# Altium footprint library myLibs.PcbLib: 48 footprints (part 2 of 3)
Each footprint in its own frame and in the unit in brackets; x right, y up, seen from the top. Pads: shape width x height; smd on the part's side, far side on the other; paste and mask are expansions set on the pad; w line width, h text height; cw(c..) or ccw(c..) is an arc to the next point about the centre after c.
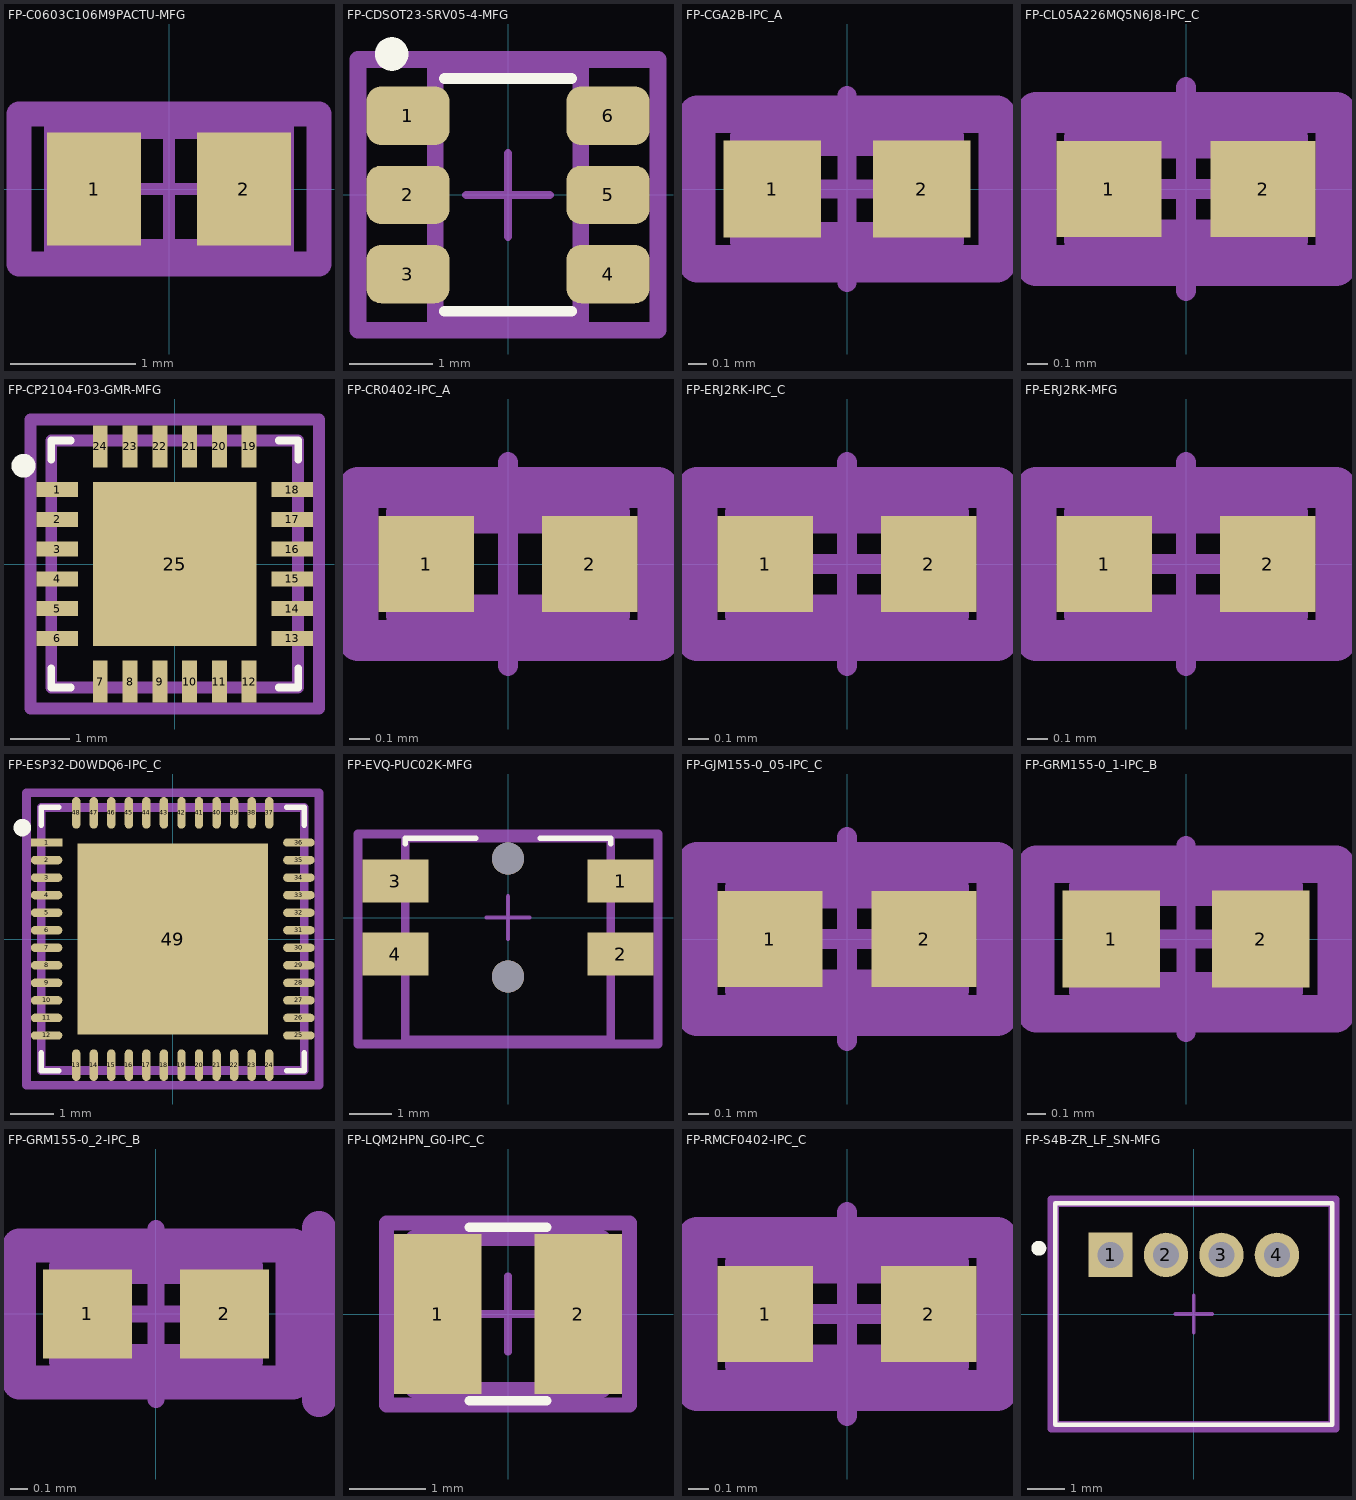
[diagram p1: the footprints below, top view; thin cyan lines are the x and y axes]

## FP-C0603C106M9PACTU-MFG [mm]
pads (2):
  rect 0.75x0.9 smd paste+0 mask+0: 1(-0.6,0) 2(0.6,0)
Top Assembly:
  lines w0.2: -1.2,-0.6 1.2,-0.6 1.2,0.6 -1.2,0.6 -1.2,-0.6
  text ".Designator" at 0.025,0.255 h1
Top 3D Body:
  lines w0.2: -0.9,-0.5 0.9,-0.5 0.9,0.5 -0.9,0.5 -0.9,-0.5
Top Courtyard:
  lines w0.2: -1.2,-0.6 1.2,-0.6 1.2,0.6 -1.2,0.6 -1.2,-0.6
Top Component Center:
  lines w0.1: -0.5,0 0.5,0 ; 0,-0.5 0,0.5
3D body "Cap_Kemet_C0603C106M9PACTU_eec.STEP": height 0.25, standoff 0, extent -1.2,-0.6 1.2,0.6

## FP-CDSOT23-SRV05-4-MFG [mm]
pads (6):
  rrect50% 1x0.7 smd paste+0 mask+0: 1(-1.2,0.95) 2(-1.2,0) 3(-1.2,-0.95) 4(1.2,-0.95) 5(1.2,0) 6(1.2,0.95)
Top Overlay:
  circle w0.25: c-1.396,1.691 r0.076
  lines w0.127: -0.762,-1.397 0.762,-1.397 ; -0.762,1.397 0.762,1.397
Top Assembly:
  lines w0.2: -1.8,-1.625 1.8,-1.625 1.8,1.625 -1.8,1.625 -1.8,-1.625
  text ".Designator" at 0,0.188 h1
Top 3D Body:
  lines w0.2: -0.875,-1.525 0.875,-1.525 0.875,1.525 -0.875,1.525 -0.875,-1.525
Top Courtyard:
  lines w0.2: -1.8,-1.625 1.8,-1.625 1.8,1.625 -1.8,1.625 -1.8,-1.625
Top Component Center:
  lines w0.1: -0.5,0 0.5,0 ; 0,-0.5 0,0.5
3D body "Diode_Bourns_Inc_CDSOT23-SRV05-4_eec.STEP": height 0.25, standoff 0, extent -1.8,-1.625 1.8,1.625

## FP-CGA2B-IPC_A [mm]
pads (2):
  rect 0.52x0.52 smd paste+0 mask+0: 1(-0.4,0) 2(0.4,0)
Top Assembly:
  lines w0.2: -0.8,-0.4 0.8,-0.4 0.8,0.4 -0.8,0.4 -0.8,-0.4
  text ".Designator" at 0,0.188 h1
Top 3D Body:
  lines w0.2: -0.525,-0.275 0.525,-0.275 0.525,0.275 -0.525,0.275 -0.525,-0.275
Top Courtyard:
  lines w0.2: -0.8,-0.4 0.8,-0.4 0.8,0.4 -0.8,0.4 -0.8,-0.4
Top Component Center:
  lines w0.1: -0.5,0 0.5,0 ; 0,-0.5 0,0.5
3D body "Cap_TDK_CGA2B1X7R1A154M050BC_eec.STEP": height 0.25, standoff 0, extent -1.036,-0.536 1.036,0.536

## FP-CL05A226MQ5N6J8-IPC_C [mm]
pads (2):
  rect 0.515x0.472 smd paste+0 mask+0: 1(-0.379,0) 2(0.379,0)
Top Assembly:
  lines w0.2: -0.736,-0.375 -0.736,0.375 0.736,0.375 0.736,-0.375 -0.736,-0.375
  text ".Designator" at 0,0.188 h1
Top 3D Body:
  lines w0.2: -0.5,-0.25 -0.5,0.25 0.5,0.25 0.5,-0.25 -0.5,-0.25
Top Courtyard:
  lines w0.2: -0.736,-0.375 -0.736,0.375 0.736,0.375 0.736,-0.375 -0.736,-0.375
Top Component Center:
  lines w0.1: -0.5,0 0.5,0 ; 0,-0.5 0,0.5
3D body "Cap_Samsung_Electro-Mechanics_CL05A226MQ5N6J8_eec.STEP": height 0.25, standoff 0, extent -0.736,-0.375 0.736,0.375

## FP-CP2104-F03-GMR-MFG [mm]
pads (25):
  rect 0.7x0.25 smd paste+0 mask+0: 1(-1.975,1.25) 2(-1.975,0.75) 3(-1.975,0.25) 4(-1.975,-0.25) 5(-1.975,-0.75) 6(-1.975,-1.25) 13(1.975,-1.25) 14(1.975,-0.75) 15(1.975,-0.25) 16(1.975,0.25) 17(1.975,0.75) 18(1.975,1.25)
  rect 0.25x0.7 smd paste+0 mask+0: 7(-1.25,-1.975) 8(-0.75,-1.975) 9(-0.25,-1.975) 10(0.25,-1.975) 11(0.75,-1.975) 12(1.25,-1.975) 19(1.25,1.975) 20(0.75,1.975) 21(0.25,1.975) 22(-0.25,1.975) 23(-0.75,1.975) 24(-1.25,1.975)
  rect 2.75x2.75 smd paste-1000 mask+0: 25(0,0)
Top Overlay:
  circle w0.25: c-2.54,1.651 r0.076
  lines w0.127: -2.075,-1.75 -2.075,-2.075 -1.75,-2.075 ; -2.075,1.75 -2.075,2.075 -1.75,2.075 ; 1.75,-2.075 2.075,-2.075 2.075,-1.75 ; 1.75,2.075 2.075,2.075 2.075,1.75
Top Paste:
  rectangle: 0.1,-1.2 1.2,-0.1
  rectangle: -1.2,-1.2 -0.1,-0.1
  rectangle: 0.1,0.1 1.2,1.2
  rectangle: -1.2,0.1 -0.1,1.2
Top Assembly:
  lines w0.2: -2.425,-2.425 -2.425,2.425 2.425,2.425 2.425,-2.425 -2.425,-2.425
  text ".Designator" at 0,0.188 h1
Top 3D Body:
  lines w0.2: -2.075,-2.075 -2.075,2.075 2.075,2.075 2.075,-2.075 -2.075,-2.075
Top Courtyard:
  lines w0.2: -2.425,-2.425 -2.425,2.425 2.425,2.425 2.425,-2.425 -2.425,-2.425
Top Component Center:
  lines w0.1: -0.5,0 0.5,0 ; 0,-0.5 0,0.5
3D body "IC_Silicon_Laboratories_CP2104-F03-GMR_eec.STEP": height 0.25, standoff 0, extent -2.425,-2.425 2.425,2.425

## FP-CR0402-IPC_A [mm]
pads (2):
  rect 0.468x0.472 smd paste+0 mask+0: 1(-0.402,0) 2(0.402,0)
Top Assembly:
  text ".Designator" at 0,0.188 h1
Top 3D Body:
  lines w0.2: -0.5,-0.25 0.5,-0.25 ; -0.5,0.25 0.5,0.25
Top Courtyard:
  lines w0.2: -0.736,-0.375 -0.736,0.375 0.736,0.375 0.736,-0.375 -0.736,-0.375
Top Component Center:
  lines w0.1: 0,-0.5 0,0.5
3D body "Res_Bourns_CR0402-FX-1243GLF_eec.STEP": height 0.25, standoff 0, extent -1.036,-0.536 1.036,0.536

## FP-ERJ2RK-IPC_C [mm]
pads (2):
  rect 0.468x0.472 smd paste+0 mask+0: 1(-0.402,0) 2(0.402,0)
Top Assembly:
  lines w0.2: -0.736,-0.375 0.736,-0.375 0.736,0.375 -0.736,0.375 -0.736,-0.375
  text ".Designator" at 0,0.188 h1
Top 3D Body:
  lines w0.2: -0.5,-0.25 0.5,-0.25 0.5,0.25 -0.5,0.25 -0.5,-0.25
Top Courtyard:
  lines w0.2: -0.736,-0.375 0.736,-0.375 0.736,0.375 -0.736,0.375 -0.736,-0.375
Top Component Center:
  lines w0.1: -0.5,0 0.5,0 ; 0,-0.5 0,0.5
3D body "Res_Panasonic_ERJ-2RKF10R0X_eec.STEP": height 0.25, standoff 0, extent -0.736,-0.375 0.736,0.375

## FP-ERJ2RK-MFG [mm]
pads (2):
  rect 0.468x0.472 smd paste+0 mask+0: 1(-0.402,0) 2(0.402,0)
Top Assembly:
  lines w0.2: -0.736,-0.375 -0.736,0.375 0.736,0.375 0.736,-0.375 -0.736,-0.375
  text ".Designator" at 0,0.188 h1
Top 3D Body:
  lines w0.2: -0.5,-0.25 -0.5,0.25 0.5,0.25 0.5,-0.25 -0.5,-0.25
Top Courtyard:
  lines w0.2: -0.736,-0.375 -0.736,0.375 0.736,0.375 0.736,-0.375 -0.736,-0.375
Top Component Center:
  lines w0.1: -0.5,0 0.5,0 ; 0,-0.5 0,0.5
3D body "Res_Panasonic_ERJ-2RKF10R0X_eec.STEP": height 0.25, standoff 0, extent -0.85,-0.375 0.85,0.375

## FP-ESP32-D0WDQ6-IPC_C [mm]
pads (49):
  rect 0.718x0.192 smd paste+0 mask+0: 1(-2.877,2.2)
  rrect100% 0.718x0.192 smd paste+0 mask+0: 2(-2.877,1.8) 3(-2.877,1.4) 4(-2.877,1) 5(-2.877,0.6) 6(-2.877,0.2) 7(-2.877,-0.2) 8(-2.877,-0.6) 9(-2.877,-1) 10(-2.877,-1.4) 11(-2.877,-1.8) 12(-2.877,-2.2) 25(2.877,-2.2) 26(2.877,-1.8) 27(2.877,-1.4) 28(2.877,-1) 29(2.877,-0.6) 30(2.877,-0.2) 31(2.877,0.2) 32(2.877,0.6) 33(2.877,1) 34(2.877,1.4) 35(2.877,1.8) 36(2.877,2.2)
  rrect100% 0.192x0.718 smd paste+0 mask+0: 13(-2.2,-2.877) 14(-1.8,-2.877) 15(-1.4,-2.877) 16(-1,-2.877) 17(-0.6,-2.877) 18(-0.2,-2.877) 19(0.2,-2.877) 20(0.6,-2.877) 21(1,-2.877) 22(1.4,-2.877) 23(1.8,-2.877) 24(2.2,-2.877) 37(2.2,2.877) 38(1.8,2.877) 39(1.4,2.877) 40(1,2.877) 41(0.6,2.877) 42(0.2,2.877) 43(-0.2,2.877) 44(-0.6,2.877) 45(-1,2.877) 46(-1.4,2.877) 47(-1.8,2.877) 48(-2.2,2.877)
  rect 4.35x4.35 smd paste-1000 mask+0: 49(0,0)
Top Overlay:
  circle w0.25: c-3.429,2.54 r0.076
  lines w0.127: -3,-2.6 -3,-3 -2.6,-3 ; -3,2.6 -3,3 -2.6,3 ; 2.6,-3 3,-3 3,-2.6 ; 2.6,3 3,3 3,2.6
Top Paste:
  rectangle: -1.376,-1.376 1.375,1.376
Top Assembly:
  lines w0.2: -3.336,-3.336 -3.336,3.336 3.336,3.336 3.336,-3.336 -3.336,-3.336
  text ".Designator" at 0,-0.001 h1
Top 3D Body:
  lines w0.2: -3,-3 -3,3 3,3 3,-3 -3,-3
Top Courtyard:
  lines w0.2: -3.336,-3.336 -3.336,3.336 3.336,3.336 3.336,-3.336 -3.336,-3.336
Top Component Center:
  lines w0.1: -0.5,0 0.5,0 ; 0,-0.5 0,0.5
3D body "IC_Espressif_Systems_ESP32-D0WDQ6_eec.STEP": height 0.25, standoff 0, extent -3.336,-3.336 3.336,3.336

## FP-EVQ-PUC02K-MFG [mm]
pads (6):
  rect 1.55x1 smd paste+0 mask+0: 1(2.625,0.85) 2(2.625,-0.85) 3(-2.625,0.85) 4(-2.625,-0.85)
  round 0.75 hole 0.75 unplated paste-1000 mask+0: ""(0,-1.375) ""(0,1.375)
Top Overlay:
  lines w0.127: -2.4,1.725 -2.4,1.85 -0.75,1.85 ; 0.75,1.85 2.4,1.85 2.4,1.725
Top Assembly:
  lines w0.2: -3.5,-2.95 -3.5,1.95 3.5,1.95 3.5,-2.95 -3.5,-2.95
  text ".Designator" at 0,-0.501 h1
Top 3D Body:
  lines w0.2: -2.4,-2.85 -2.4,1.85 2.4,1.85 2.4,-2.85 -2.4,-2.85
Top Courtyard:
  lines w0.2: -3.5,-2.95 -3.5,1.95 3.5,1.95 3.5,-2.95 -3.5,-2.95
Top Component Center:
  lines w0.1: -0.5,0 0.5,0 ; 0,-0.5 0,0.5
3D body "Switch_Panasonic_Electronic_Components_EVQ-PUC02K_eec.STEP": height 0.25, standoff 0, extent -3.5,-2.95 3.5,1.95

## FP-GJM155-0_05-IPC_C [mm]
pads (2):
  rect 0.515x0.472 smd paste+0 mask+0: 1(-0.379,0) 2(0.379,0)
Top Assembly:
  lines w0.2: -0.736,-0.375 0.736,-0.375 0.736,0.375 -0.736,0.375 -0.736,-0.375
  text ".Designator" at 0,0.188 h1
Top 3D Body:
  lines w0.2: -0.5,-0.25 0.5,-0.25 0.5,0.25 -0.5,0.25 -0.5,-0.25
Top Courtyard:
  lines w0.2: -0.736,-0.375 0.736,-0.375 0.736,0.375 -0.736,0.375 -0.736,-0.375
Top Component Center:
  lines w0.1: -0.5,0 0.5,0 ; 0,-0.5 0,0.5
3D body "Cap_Murata_GJM1551C1H7R0DB01D_eec.STEP": height 0.25, standoff 0, extent -0.736,-0.375 0.736,0.375

## FP-GRM155-0_1-IPC_B [mm]
pads (2):
  rect 0.52x0.52 smd paste+0 mask+0: 1(-0.4,0) 2(0.4,0)
Top Assembly:
  lines w0.2: -0.8,-0.4 -0.8,0.4 0.8,0.4 0.8,-0.4 -0.8,-0.4
  text ".Designator" at 0,0.188 h1
Top 3D Body:
  lines w0.2: -0.525,-0.275 -0.525,0.275 0.525,0.275 0.525,-0.275 -0.525,-0.275
Top Courtyard:
  lines w0.2: -0.8,-0.4 -0.8,0.4 0.8,0.4 0.8,-0.4 -0.8,-0.4
Top Component Center:
  lines w0.1: -0.5,0 0.5,0 ; 0,-0.5 0,0.5
3D body "Cap_Murata_GRM155C81E105KE11D_eec.STEP": height 0.25, standoff 0, extent -0.886,-0.436 0.886,0.436

## FP-GRM155-0_2-IPC_B [mm]
pads (2):
  rect 0.52x0.52 smd paste+0 mask+0: 1(-0.4,0) 2(0.4,0)
Top Assembly:
  lines w0.2: 0.953,-0.503 0.953,0.503 ; -0.8,-0.4 -0.8,0.4 0.8,0.4 0.8,-0.4 -0.8,-0.4
  text ".Designator" at 0,0.188 h1
Top 3D Body:
  lines w0.2: -0.525,-0.275 -0.525,0.275 0.525,0.275 0.525,-0.275 -0.525,-0.275
Top Courtyard:
  lines w0.2: -0.8,-0.4 -0.8,0.4 0.8,0.4 0.8,-0.4 -0.8,-0.4
Top Component Center:
  lines w0.1: -0.5,0 0.5,0 ; 0,-0.5 0,0.5
3D body "Cap_Murata_GRM155R61E225KE11D_eec.STEP": height 0.25, standoff 0, extent -0.953,-0.503 0.953,0.503

## FP-LQM2HPN_G0-IPC_C [mm]
pads (2):
  rect 1.155x2.106 smd paste+0 mask+0: 1(-0.926,0) 2(0.926,0)
Top Overlay:
  lines w0.127: -0.508,-1.143 0.508,-1.143 ; -0.508,1.143 0.508,1.143
Top Assembly:
  lines w0.2: -1.603,-1.2 1.603,-1.2 1.603,1.2 -1.603,1.2 -1.603,-1.2
  text ".Designator" at 0,0.188 h1
Top 3D Body:
  lines w0.2: -1.25,-1 1.25,-1 1.25,1 -1.25,1 -1.25,-1
Top Courtyard:
  lines w0.2: -1.603,-1.2 1.603,-1.2 1.603,1.2 -1.603,1.2 -1.603,-1.2
Top Component Center:
  lines w0.1: -0.5,0 0.5,0 ; 0,-0.5 0,0.5
3D body "UNK_Murata_LQM2HPZ2R2MGSB_eec.STEP": height 0.25, standoff 0, extent -1.603,-1.2 1.603,1.2

## FP-RMCF0402-IPC_C [mm]
pads (2):
  rect 0.468x0.472 smd paste+0 mask+0: 1(-0.402,0) 2(0.402,0)
Top Assembly:
  lines w0.2: -0.736,-0.375 -0.736,0.375 0.736,0.375 0.736,-0.375 -0.736,-0.375
  text ".Designator" at 0,0.188 h1
Top 3D Body:
  lines w0.2: -0.5,-0.25 -0.5,0.25 0.5,0.25 0.5,-0.25 -0.5,-0.25
Top Courtyard:
  lines w0.2: -0.736,-0.375 -0.736,0.375 0.736,0.375 0.736,-0.375 -0.736,-0.375
Top Component Center:
  lines w0.1: -0.5,0 0.5,0 ; 0,-0.5 0,0.5
3D body "Res_Stackpole_Electronics_RMCF0402FT1K00_eec.STEP": height 0.25, standoff 0, extent -0.756,-0.375 0.756,0.375

## FP-S4B-ZR_LF_SN-MFG [mm]
pads (4):
  rect 1.2x1.2 hole 0.7 paste-1000 mask+0: 1(-2.25,1.6)
  round 1.2 hole 0.7 paste-1000 mask+0: 2(-0.75,1.6) 3(0.75,1.6) 4(2.25,1.6)
Top Overlay:
  circle w0.25: c-4.191,1.778 r0.076
  lines w0.127: -3.75,-3 3.75,-3 3.75,3 -3.75,3 -3.75,-3
Top Assembly:
  lines w0.2: -3.85,-3.1 3.85,-3.1 3.85,3.1 -3.85,3.1 -3.85,-3.1
  text ".Designator" at 0,0.188 h1
Top 3D Body:
  lines w0.2: -3.75,-3 3.75,-3 3.75,3 -3.75,3 -3.75,-3
Top Courtyard:
  lines w0.2: -3.85,-3.1 3.85,-3.1 3.85,3.1 -3.85,3.1 -3.85,-3.1
Top Component Center:
  lines w0.1: -0.5,0 0.5,0 ; 0,-0.5 0,0.5
3D body "Conn_JST_S4B-ZR_LF_SN_eec.STEP": height 0.25, standoff 0, extent -3.85,-3.1 3.85,3.1